# Altium footprint library Key & Switch's.PcbLib: 58 footprints (part 2 of 4)
Each footprint in its own frame and in the unit in brackets; x right, y up, seen from the top. Pads: shape width x height; smd on the part's side, far side on the other; paste and mask are expansions set on the pad; w line width, h text height; cw(c..) or ccw(c..) is an arc to the next point about the centre after c.
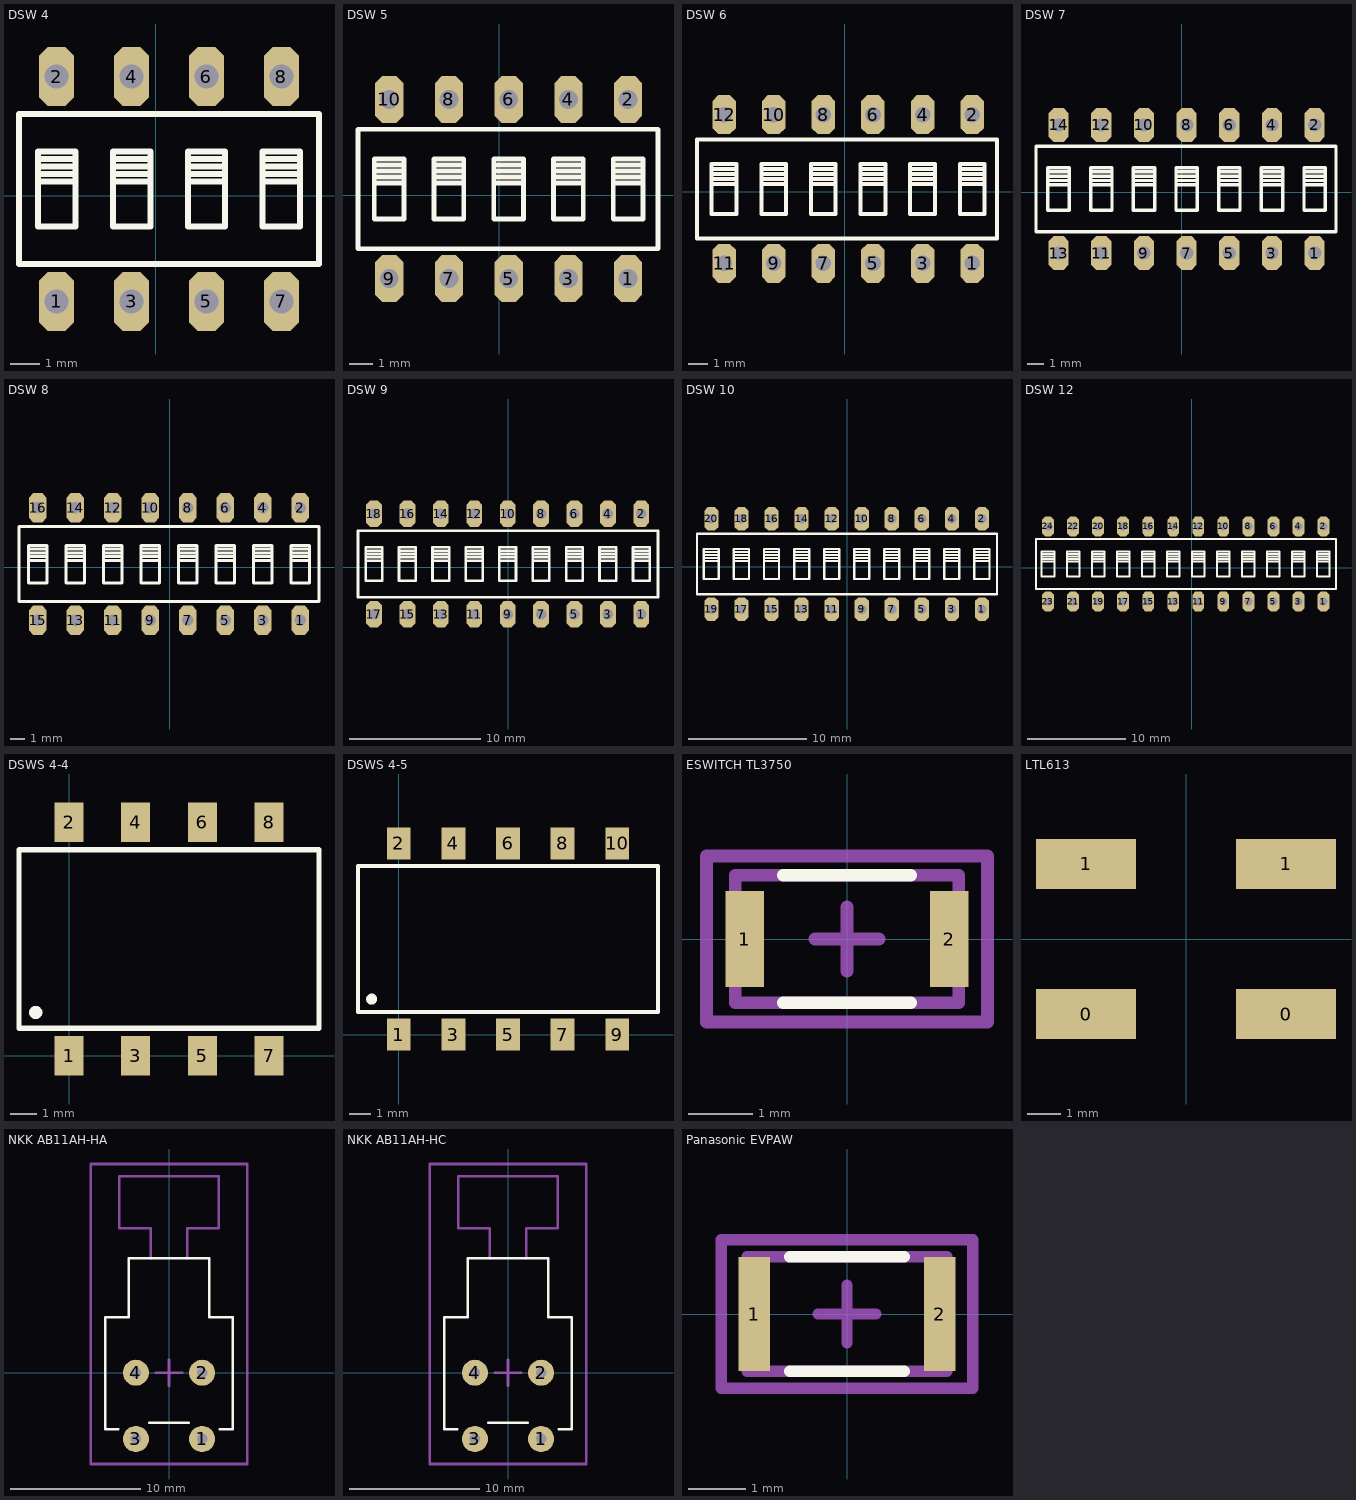
[diagram p1: the footprints below, top view; thin cyan lines are the x and y axes]

## DSW 4 [mm]
height 0.001
pads (8):
  oct 1.2x2 hole 0.8: 1(-3.364,-3.585) 2(-3.364,4.035) 3(-0.824,-3.585) 4(-0.824,4.035) 5(1.716,-3.585) 6(1.716,4.035) 7(4.256,-3.585) 8(4.256,4.035)
Top Overlay:
  lines w0.203: -3.999,0.479 -2.729,0.479 ; -3.999,0.733 -2.729,0.733 ; -3.999,0.987 -2.729,0.987 ; -3.999,1.241 -2.729,1.241 ; -1.459,0.479 -0.189,0.479 ; -1.459,0.733 -0.189,0.733 ; -1.459,0.987 -0.189,0.987 ; -1.459,1.241 -0.189,1.241 ; 1.081,0.479 2.351,0.479 ; 1.081,0.733 2.351,0.733 ; 1.081,0.987 2.351,0.987 ; 1.081,1.241 2.351,1.241 ; 3.621,0.479 4.891,0.479 ; 3.621,0.733 4.891,0.733 ; 3.621,0.987 4.891,0.987 ; 3.621,1.241 4.891,1.241 ; -4.634,-2.315 5.526,-2.315 5.526,2.765 -4.634,2.765 -4.634,-2.315 ; -3.999,-1.045 -2.729,-1.045 -2.729,1.495 -3.999,1.495 -3.999,-1.045 ; -1.459,-1.045 -0.189,-1.045 -0.189,1.495 -1.459,1.495 -1.459,-1.045 ; 1.081,-1.045 2.351,-1.045 2.351,1.495 1.081,1.495 1.081,-1.045 ; 3.621,-1.045 4.891,-1.045 4.891,1.495 3.621,1.495 3.621,-1.045
3D body "SWD1-4.step": height 8, standoff -2.7, extent -5.105,-4.7 6.055,5.2

## DSW 5 [mm]
height 0.001
pads (10):
  oct 1.2x2 hole 0.8: 1(5.471,-3.54) 2(5.471,4.08) 3(2.931,-3.54) 4(2.931,4.08) 5(0.391,-3.54) 6(0.391,4.08) 7(-2.149,-3.54) 8(-2.149,4.08) 9(-4.689,-3.54) 10(-4.689,4.08)
Top Overlay:
  lines w0.203: -5.324,0.524 -4.054,0.524 ; -5.324,0.778 -4.054,0.778 ; -5.324,1.032 -4.054,1.032 ; -5.324,1.286 -4.054,1.286 ; -2.784,0.524 -1.514,0.524 ; -2.784,0.778 -1.514,0.778 ; -2.784,1.032 -1.514,1.032 ; -2.784,1.286 -1.514,1.286 ; -0.244,0.524 1.026,0.524 ; -0.244,0.778 1.026,0.778 ; -0.244,1.032 1.026,1.032 ; -0.244,1.286 1.026,1.286 ; 2.296,0.524 3.566,0.524 ; 2.296,0.778 3.566,0.778 ; 2.296,1.032 3.566,1.032 ; 2.296,1.286 3.566,1.286 ; 4.836,0.524 6.106,0.524 ; 4.836,0.778 6.106,0.778 ; 4.836,1.032 6.106,1.032 ; 4.836,1.286 6.106,1.286 ; -6.015,-2.27 -6.015,2.81 6.741,2.81 6.741,-2.27 -6.015,-2.27 ; -5.324,-1 -5.324,1.54 -4.054,1.54 -4.054,-1 -5.324,-1 ; -2.784,-1 -2.784,1.54 -1.514,1.54 -1.514,-1 -2.784,-1 ; -0.244,-1 -0.244,1.54 1.026,1.54 1.026,-1 -0.244,-1 ; 2.296,-1 2.296,1.54 3.566,1.54 3.566,-1 2.296,-1 ; 4.836,-1 4.836,1.54 6.106,1.54 6.106,-1 4.836,-1
3D body "SWD1-5.step": height 8, standoff -2.7, extent -6.515,-4.665 7.185,5.235

## DSW 6 [mm]
pads (12):
  oct 1.2x2 hole 0.8: 1(6.511,-3.66) 2(6.511,3.96) 3(3.971,-3.66) 4(3.971,3.96) 5(1.431,-3.66) 6(1.431,3.96) 7(-1.109,-3.66) 8(-1.109,3.96) 9(-3.649,-3.66) 10(-3.649,3.96) 11(-6.189,-3.66) 12(-6.189,3.96)
Top Overlay:
  lines w0.203: -6.824,0.404 -5.554,0.404 ; -6.824,0.658 -5.554,0.658 ; -6.824,0.912 -5.554,0.912 ; -6.824,1.166 -5.554,1.166 ; -4.284,0.404 -3.014,0.404 ; -4.284,0.658 -3.014,0.658 ; -4.284,0.912 -3.014,0.912 ; -4.284,1.166 -3.014,1.166 ; -1.744,0.404 -0.474,0.404 ; -1.744,0.658 -0.474,0.658 ; -1.744,0.912 -0.474,0.912 ; -1.744,1.166 -0.474,1.166 ; 0.796,0.404 2.066,0.404 ; 0.796,0.658 2.066,0.658 ; 0.796,0.912 2.066,0.912 ; 0.796,1.166 2.066,1.166 ; 3.336,0.404 4.606,0.404 ; 3.336,0.658 4.606,0.658 ; 3.336,0.912 4.606,0.912 ; 3.336,1.166 4.606,1.166 ; 5.876,0.404 7.146,0.404 ; 5.876,0.658 7.146,0.658 ; 5.876,0.912 7.146,0.912 ; 5.876,1.166 7.146,1.166 ; -7.575,-2.39 -7.575,2.69 7.781,2.69 7.781,-2.39 -7.575,-2.39 ; -6.824,-1.12 -6.824,1.42 -5.554,1.42 -5.554,-1.12 -6.824,-1.12 ; -4.284,-1.12 -4.284,1.42 -3.014,1.42 -3.014,-1.12 -4.284,-1.12 ; -1.744,-1.12 -1.744,1.42 -0.474,1.42 -0.474,-1.12 -1.744,-1.12 ; 0.796,-1.12 0.796,1.42 2.066,1.42 2.066,-1.12 0.796,-1.12 ; 3.336,-1.12 3.336,1.42 4.606,1.42 4.606,-1.12 3.336,-1.12 ; 5.876,-1.12 5.876,1.42 7.146,1.42 7.146,-1.12 5.876,-1.12
3D body "SW3dPS-DIPSWITCH.STEP": height 7.9, standoff -2.2, extent -8.28,-4.945 8.48,5.215

## DSW 7 [mm]
pads (14):
  oct 1.2x2 hole 0.8: 1(7.921,-3.625) 2(7.921,3.995) 3(5.381,-3.625) 4(5.381,3.995) 5(2.841,-3.625) 6(2.841,3.995) 7(0.301,-3.625) 8(0.301,3.995) 9(-2.239,-3.625) 10(-2.239,3.995) 11(-4.779,-3.625) 12(-4.779,3.995) 13(-7.319,-3.625) 14(-7.319,3.995)
Top Overlay:
  lines w0.203: -7.954,0.439 -6.684,0.439 ; -7.954,0.693 -6.684,0.693 ; -7.954,0.947 -6.684,0.947 ; -7.954,1.201 -6.684,1.201 ; -5.414,0.439 -4.144,0.439 ; -5.414,0.693 -4.144,0.693 ; -5.414,0.947 -4.144,0.947 ; -5.414,1.201 -4.144,1.201 ; -2.874,0.439 -1.604,0.439 ; -2.874,0.693 -1.604,0.693 ; -2.874,0.947 -1.604,0.947 ; -2.874,1.201 -1.604,1.201 ; -0.334,0.439 0.936,0.439 ; -0.334,0.693 0.936,0.693 ; -0.334,0.947 0.936,0.947 ; -0.334,1.201 0.936,1.201 ; 2.206,0.439 3.476,0.439 ; 2.206,0.693 3.476,0.693 ; 2.206,0.947 3.476,0.947 ; 2.206,1.201 3.476,1.201 ; 4.746,0.439 6.016,0.439 ; 4.746,0.693 6.016,0.693 ; 4.746,0.947 6.016,0.947 ; 4.746,1.201 6.016,1.201 ; 7.286,0.439 8.556,0.439 ; 7.286,0.693 8.556,0.693 ; 7.286,0.947 8.556,0.947 ; 7.286,1.201 8.556,1.201 ; -8.665,-2.355 -8.665,2.725 9.191,2.725 9.191,-2.355 -8.665,-2.355 ; -7.954,-1.085 -7.954,1.455 -6.684,1.455 -6.684,-1.085 -7.954,-1.085 ; -5.414,-1.085 -5.414,1.455 -4.144,1.455 -4.144,-1.085 -5.414,-1.085 ; -2.874,-1.085 -2.874,1.455 -1.604,1.455 -1.604,-1.085 -2.874,-1.085 ; -0.334,-1.085 -0.334,1.455 0.936,1.455 0.936,-1.085 -0.334,-1.085 ; 2.206,-1.085 2.206,1.455 3.476,1.455 3.476,-1.085 2.206,-1.085 ; 4.746,-1.085 4.746,1.455 6.016,1.455 6.016,-1.085 4.746,-1.085 ; 7.286,-1.085 7.286,1.455 8.556,1.455 8.556,-1.085 7.286,-1.085
3D body "User Library-DIPSWITCH7.STEP": height 6.9, standoff -3.2, extent -9.316,-4.826 9.824,5.334

## DSW 8 [mm]
pads (16):
  oct 1.2x2 hole 0.8: 1(8.836,-3.575) 2(8.836,4.045) 3(6.296,-3.575) 4(6.296,4.045) 5(3.756,-3.575) 6(3.756,4.045) 7(1.216,-3.575) 8(1.216,4.045) 9(-1.324,-3.575) 10(-1.324,4.045) 11(-3.864,-3.575) 12(-3.864,4.045) 13(-6.404,-3.575) 14(-6.404,4.045) 15(-8.944,-3.575) 16(-8.944,4.045)
Top Overlay:
  lines w0.203: -9.579,0.489 -8.309,0.489 ; -9.579,0.743 -8.309,0.743 ; -9.579,0.997 -8.309,0.997 ; -9.579,1.251 -8.309,1.251 ; -7.039,0.489 -5.769,0.489 ; -7.039,0.743 -5.769,0.743 ; -7.039,0.997 -5.769,0.997 ; -7.039,1.251 -5.769,1.251 ; -4.499,0.489 -3.229,0.489 ; -4.499,0.743 -3.229,0.743 ; -4.499,0.997 -3.229,0.997 ; -4.499,1.251 -3.229,1.251 ; -1.959,0.489 -0.689,0.489 ; -1.959,0.743 -0.689,0.743 ; -1.959,0.997 -0.689,0.997 ; -1.959,1.251 -0.689,1.251 ; 0.581,0.489 1.851,0.489 ; 0.581,0.743 1.851,0.743 ; 0.581,0.997 1.851,0.997 ; 0.581,1.251 1.851,1.251 ; 3.121,0.489 4.391,0.489 ; 3.121,0.743 4.391,0.743 ; 3.121,0.997 4.391,0.997 ; 3.121,1.251 4.391,1.251 ; 5.661,0.489 6.931,0.489 ; 5.661,0.743 6.931,0.743 ; 5.661,0.997 6.931,0.997 ; 5.661,1.251 6.931,1.251 ; 8.201,0.489 9.471,0.489 ; 8.201,0.743 9.471,0.743 ; 8.201,0.997 9.471,0.997 ; 8.201,1.251 9.471,1.251 ; -10.214,-2.305 10.106,-2.305 10.106,2.775 -10.214,2.775 -10.214,-2.305 ; -9.579,-1.035 -8.309,-1.035 -8.309,1.505 -9.579,1.505 -9.579,-1.035 ; -7.039,-1.035 -5.769,-1.035 -5.769,1.505 -7.039,1.505 -7.039,-1.035 ; -4.499,-1.035 -3.229,-1.035 -3.229,1.505 -4.499,1.505 -4.499,-1.035 ; -1.959,-1.035 -0.689,-1.035 -0.689,1.505 -1.959,1.505 -1.959,-1.035 ; 0.581,-1.035 1.851,-1.035 1.851,1.505 0.581,1.505 0.581,-1.035 ; 3.121,-1.035 4.391,-1.035 4.391,1.505 3.121,1.505 3.121,-1.035 ; 5.661,-1.035 6.931,-1.035 6.931,1.505 5.661,1.505 5.661,-1.035 ; 8.201,-1.035 9.471,-1.035 9.471,1.505 8.201,1.505 8.201,-1.035
3D body "SW3dPS-DIP SWITCH 8 POS CTS 206.STEP": height 9.25, standoff -2.5, extent -11.275,-4.655 11.225,5.125

## DSW 9 [mm]
pads (18):
  oct 1.2x2 hole 0.8: 1(10.106,-3.575) 2(10.106,4.045) 3(7.566,-3.575) 4(7.566,4.045) 5(5.026,-3.575) 6(5.026,4.045) 7(2.486,-3.575) 8(2.486,4.045) 9(-0.054,-3.575) 10(-0.054,4.045) 11(-2.594,-3.575) 12(-2.594,4.045) 13(-5.134,-3.575) 14(-5.134,4.045) 15(-7.674,-3.575) 16(-7.674,4.045) 17(-10.214,-3.575) 18(-10.214,4.045)
Top Overlay:
  lines w0.203: -10.849,0.489 -9.579,0.489 ; -10.849,0.743 -9.579,0.743 ; -10.849,0.997 -9.579,0.997 ; -10.849,1.251 -9.579,1.251 ; -8.309,0.489 -7.039,0.489 ; -8.309,0.743 -7.039,0.743 ; -8.309,0.997 -7.039,0.997 ; -8.309,1.251 -7.039,1.251 ; -5.769,0.489 -4.499,0.489 ; -5.769,0.743 -4.499,0.743 ; -5.769,0.997 -4.499,0.997 ; -5.769,1.251 -4.499,1.251 ; -3.229,0.489 -1.959,0.489 ; -3.229,0.743 -1.959,0.743 ; -3.229,0.997 -1.959,0.997 ; -3.229,1.251 -1.959,1.251 ; -0.689,0.489 0.581,0.489 ; -0.689,0.743 0.581,0.743 ; -0.689,0.997 0.581,0.997 ; -0.689,1.251 0.581,1.251 ; 1.851,0.489 3.121,0.489 ; 1.851,0.743 3.121,0.743 ; 1.851,0.997 3.121,0.997 ; 1.851,1.251 3.121,1.251 ; 4.391,0.489 5.661,0.489 ; 4.391,0.743 5.661,0.743 ; 4.391,0.997 5.661,0.997 ; 4.391,1.251 5.661,1.251 ; 6.931,0.489 8.201,0.489 ; 6.931,0.743 8.201,0.743 ; 6.931,0.997 8.201,0.997 ; 6.931,1.251 8.201,1.251 ; 9.471,0.489 10.741,0.489 ; 9.471,0.743 10.741,0.743 ; 9.471,0.997 10.741,0.997 ; 9.471,1.251 10.741,1.251 ; -11.43,-2.305 11.376,-2.305 11.376,2.775 -11.43,2.775 -11.43,-2.305 ; -10.849,-1.035 -10.849,1.505 -9.579,1.505 -9.579,-1.035 -10.849,-1.035 ; -8.309,-1.035 -7.039,-1.035 -7.039,1.505 -8.309,1.505 -8.309,-1.035 ; -5.769,-1.035 -4.499,-1.035 -4.499,1.505 -5.769,1.505 -5.769,-1.035 ; -3.229,-1.035 -1.959,-1.035 -1.959,1.505 -3.229,1.505 -3.229,-1.035 ; -0.689,-1.035 0.581,-1.035 0.581,1.505 -0.689,1.505 -0.689,-1.035 ; 1.851,-1.035 3.121,-1.035 3.121,1.505 1.851,1.505 1.851,-1.035 ; 4.391,-1.035 5.661,-1.035 5.661,1.505 4.391,1.505 4.391,-1.035 ; 6.931,-1.035 8.201,-1.035 8.201,1.505 6.931,1.505 6.931,-1.035 ; 9.471,-1.035 10.741,-1.035 10.741,1.505 9.471,1.505 9.471,-1.035
3D body "User Library-DIPSWITCH9.STEP": height 7.4, standoff -2.7, extent -12.237,-4.826 11.983,5.334

## DSW 10 [mm]
pads (20):
  oct 1.2x2 hole 0.8: 1(11.376,-3.575) 2(11.376,4.045) 3(8.836,-3.575) 4(8.836,4.045) 5(6.296,-3.575) 6(6.296,4.045) 7(3.756,-3.575) 8(3.756,4.045) 9(1.216,-3.575) 10(1.216,4.045) 11(-1.324,-3.575) 12(-1.324,4.045) 13(-3.864,-3.575) 14(-3.864,4.045) 15(-6.404,-3.575) 16(-6.404,4.045) 17(-8.944,-3.575) 18(-8.944,4.045) 19(-11.484,-3.575) 20(-11.484,4.045)
Top Overlay:
  lines w0.203: -12.119,0.489 -10.849,0.489 ; -12.119,0.743 -10.849,0.743 ; -12.119,0.997 -10.849,0.997 ; -12.119,1.251 -10.849,1.251 ; -9.579,0.489 -8.309,0.489 ; -9.579,0.743 -8.309,0.743 ; -9.579,0.997 -8.309,0.997 ; -9.579,1.251 -8.309,1.251 ; -7.039,0.489 -5.769,0.489 ; -7.039,0.743 -5.769,0.743 ; -7.039,0.997 -5.769,0.997 ; -7.039,1.251 -5.769,1.251 ; -4.499,0.489 -3.229,0.489 ; -4.499,0.743 -3.229,0.743 ; -4.499,0.997 -3.229,0.997 ; -4.499,1.251 -3.229,1.251 ; -1.959,0.489 -0.689,0.489 ; -1.959,0.743 -0.689,0.743 ; -1.959,0.997 -0.689,0.997 ; -1.959,1.251 -0.689,1.251 ; 0.581,0.489 1.851,0.489 ; 0.581,0.743 1.851,0.743 ; 0.581,0.997 1.851,0.997 ; 0.581,1.251 1.851,1.251 ; 3.121,0.489 4.391,0.489 ; 3.121,0.743 4.391,0.743 ; 3.121,0.997 4.391,0.997 ; 3.121,1.251 4.391,1.251 ; 5.661,0.489 6.931,0.489 ; 5.661,0.743 6.931,0.743 ; 5.661,0.997 6.931,0.997 ; 5.661,1.251 6.931,1.251 ; 8.201,0.489 9.471,0.489 ; 8.201,0.743 9.471,0.743 ; 8.201,0.997 9.471,0.997 ; 8.201,1.251 9.471,1.251 ; 10.741,0.489 12.011,0.489 ; 10.741,0.743 12.011,0.743 ; 10.741,0.997 12.011,0.997 ; 10.741,1.251 12.011,1.251 ; -12.7,-2.305 -12.7,2.775 12.646,2.775 12.646,-2.305 -12.7,-2.305 ; -12.119,-1.035 -12.119,1.505 -10.849,1.505 -10.849,-1.035 -12.119,-1.035 ; -9.579,-1.035 -8.309,-1.035 -8.309,1.505 -9.579,1.505 -9.579,-1.035 ; -7.039,-1.035 -7.039,1.505 -5.769,1.505 -5.769,-1.035 -7.039,-1.035 ; -4.499,-1.035 -4.499,1.505 -3.229,1.505 -3.229,-1.035 -4.499,-1.035 ; -1.959,-1.035 -1.959,1.505 -0.689,1.505 -0.689,-1.035 -1.959,-1.035 ; 0.581,-1.035 0.581,1.505 1.851,1.505 1.851,-1.035 0.581,-1.035 ; 3.121,-1.035 3.121,1.505 4.391,1.505 4.391,-1.035 3.121,-1.035 ; 5.661,-1.035 5.661,1.505 6.931,1.505 6.931,-1.035 5.661,-1.035 ; 8.201,-1.035 8.201,1.505 9.471,1.505 9.471,-1.035 8.201,-1.035 ; 10.741,-1.035 10.741,1.505 12.011,1.505 12.011,-1.035 10.741,-1.035
3D body "User Library-DIPSWITCH10.STEP": height 7.4, standoff -2.7, extent -13.507,-4.826 13.253,5.334

## DSW 12 [mm]
pads (24):
  oct 1.2x2 hole 0.8: 1(13.335,-3.429) 2(13.335,4.191) 3(10.795,-3.429) 4(10.795,4.191) 5(8.255,-3.429) 6(8.255,4.191) 7(5.715,-3.429) 8(5.715,4.191) 9(3.175,-3.429) 10(3.175,4.191) 11(0.635,-3.429) 12(0.635,4.191) 13(-1.905,-3.429) 14(-1.905,4.191) 15(-4.445,-3.429) 16(-4.445,4.191) 17(-6.985,-3.429) 18(-6.985,4.191) 19(-9.525,-3.429) 20(-9.525,4.191) 21(-12.065,-3.429) 22(-12.065,4.191) 23(-14.605,-3.429) 24(-14.605,4.191)
Top Overlay:
  lines w0.203: -15.24,0.635 -13.97,0.635 ; -15.24,0.889 -13.97,0.889 ; -15.24,1.143 -13.97,1.143 ; -15.24,1.397 -13.97,1.397 ; -12.7,0.635 -11.43,0.635 ; -12.7,0.889 -11.43,0.889 ; -12.7,1.143 -11.43,1.143 ; -12.7,1.397 -11.43,1.397 ; -10.16,0.635 -8.89,0.635 ; -10.16,0.889 -8.89,0.889 ; -10.16,1.143 -8.89,1.143 ; -10.16,1.397 -8.89,1.397 ; -7.62,0.635 -6.35,0.635 ; -7.62,0.889 -6.35,0.889 ; -7.62,1.143 -6.35,1.143 ; -7.62,1.397 -6.35,1.397 ; -5.08,0.635 -3.81,0.635 ; -5.08,0.889 -3.81,0.889 ; -5.08,1.143 -3.81,1.143 ; -5.08,1.397 -3.81,1.397 ; -2.54,0.635 -1.27,0.635 ; -2.54,0.889 -1.27,0.889 ; -2.54,1.143 -1.27,1.143 ; -2.54,1.397 -1.27,1.397 ; 0,0.635 1.27,0.635 ; 0,0.889 1.27,0.889 ; 0,1.143 1.27,1.143 ; 0,1.397 1.27,1.397 ; 2.54,0.635 3.81,0.635 ; 2.54,0.889 3.81,0.889 ; 2.54,1.143 3.81,1.143 ; 2.54,1.397 3.81,1.397 ; 5.08,0.635 6.35,0.635 ; 5.08,0.889 6.35,0.889 ; 5.08,1.143 6.35,1.143 ; 5.08,1.397 6.35,1.397 ; 7.62,0.635 8.89,0.635 ; 7.62,0.889 8.89,0.889 ; 7.62,1.143 8.89,1.143 ; 7.62,1.397 8.89,1.397 ; 10.16,0.635 11.43,0.635 ; 10.16,0.889 11.43,0.889 ; 10.16,1.143 11.43,1.143 ; 10.16,1.397 11.43,1.397 ; 12.7,0.635 13.97,0.635 ; 12.7,0.889 13.97,0.889 ; 12.7,1.143 13.97,1.143 ; 12.7,1.397 13.97,1.397 ; -15.821,-2.159 -15.821,2.921 14.605,2.921 14.605,-2.159 -15.821,-2.159 ; -15.24,-0.889 -13.97,-0.889 -13.97,1.651 -15.24,1.651 -15.24,-0.889 ; -12.7,-0.889 -11.43,-0.889 -11.43,1.651 -12.7,1.651 -12.7,-0.889 ; -10.16,-0.889 -10.16,1.651 -8.89,1.651 -8.89,-0.889 -10.16,-0.889 ; -7.62,-0.889 -6.35,-0.889 -6.35,1.651 -7.62,1.651 -7.62,-0.889 ; -5.08,-0.889 -5.08,1.651 -3.81,1.651 -3.81,-0.889 -5.08,-0.889 ; -2.54,-0.889 -2.54,1.651 -1.27,1.651 -1.27,-0.889 -2.54,-0.889 ; 0,-0.889 0,1.651 1.27,1.651 1.27,-0.889 0,-0.889 ; 2.54,-0.889 2.54,1.651 3.81,1.651 3.81,-0.889 2.54,-0.889 ; 5.08,-0.889 5.08,1.651 6.35,1.651 6.35,-0.889 5.08,-0.889 ; 7.62,-0.889 7.62,1.651 8.89,1.651 8.89,-0.889 7.62,-0.889 ; 10.16,-0.889 10.16,1.651 11.43,1.651 11.43,-0.889 10.16,-0.889 ; 12.7,-0.889 12.7,1.651 13.97,1.651 13.97,-0.889 12.7,-0.889
3D body "User Library-DIPSWITCH12.STEP": height 7.4, standoff -2.7, extent -16.603,-4.68 15.237,5.48

## DSWS 4-4 [mm]
height 0.001
pads (8):
  rect 1.1x1.5 smd: 1(0,0) 2(0,8.9) 3(2.54,0) 4(2.54,8.9) 5(5.08,0) 6(5.08,8.9) 7(7.62,0) 8(7.62,8.9)
Top Overlay:
  circle w0.254: c-1.27,1.651 r0.127
  lines w0.2: -1.905,1.05 -1.905,7.85 9.525,7.85 9.525,1.05 -1.905,1.05
3D body "SWD4-4e.stp": height 4.4, standoff 0, extent -1.74,-0.455 9.36,9.345

## DSWS 4-5 [mm]
height 0.001
pads (10):
  rect 1.1x1.5 smd: 1(0,0) 2(0,8.9) 3(2.54,0) 4(2.54,8.9) 5(5.08,0) 6(5.08,8.9) 7(7.62,0) 8(7.62,8.9) 9(10.16,0) 10(10.16,8.9)
Top Overlay:
  circle w0.254: c-1.27,1.651 r0.127
  lines w0.2: -1.905,1.05 -1.905,7.85 12.065,7.85 12.065,1.05 -1.905,1.05
3D body "SWD4-5e.stp": height 4.4, standoff 0, extent -1.74,-0.455 11.9,9.345

## ESWITCH TL3750 [mm]
height 0.6
pads (2):
  rect 0.6x1.5 smd: 1(-1.6,0) 2(1.6,0)
Top Overlay:
  lines w0.2: -1,-1 1,-1 ; -1,1 1,1
Mechanical 1:
  lines w0.2: -1.75,-1 -1.75,1 1.75,1 1.75,-1 -1.75,-1
Mechanical 15:
  lines w0.2: -0.5,0 0.5,0 ; 0,-0.5 0,0.5 ; -2.2,-1.3 -2.2,1.3 2.2,1.3 2.2,-1.3 -2.2,-1.3
3D body "TL3750AFxxxQG.STEP": height 0.58, standoff 0, extent -1.75,-1 1.75,1

## LTL613 [mm]
pads (4):
  rect 3x1.5 smd: 0(-3,-2.25) 0(3,-2.25) 1(-3,2.25) 1(3,2.25)
3D body "LTL613.stp": height 5, standoff 0, extent -4.039,-3 4.039,3

## NKK AB11AH-HA [mm]
height 6.18
pads (4):
  round 2 hole 0.8: 1(2.54,-5.08) 2(2.54,0) 3(-2.54,-5.08) 4(-2.54,0)
Top Overlay:
  lines w0.2: -3.9,-4.34 -4.9,-4.34 -4.9,4.26 -3.1,4.26 -3.1,8.76 3.1,8.76 3.1,4.26 4.9,4.26 4.9,-4.34 3.9,-4.34 ; -1.5,-3.84 1.5,-3.84
Mechanical 1:
  lines w0.2: -1.4,8.76 -1.4,11.06 -3.8,11.06 -3.8,15.06 3.8,15.06 3.8,11.06 1.4,11.06 1.4,8.76
Mechanical 15:
  lines w0.2: -1,0 1,0 ; 0,-1 0,1 ; -6,-7 -6,16 6,16 6,-7 -6,-7
3D body "NKK AB11AH-HA.STEP": height 7.06, standoff -3.1, extent -4.902,-5.39 4.902,15.082

## NKK AB11AH-HC [mm]
height 6.18
pads (4):
  round 2 hole 0.8: 1(2.54,-5.08) 2(2.54,0) 3(-2.54,-5.08) 4(-2.54,0)
Top Overlay:
  lines w0.2: -3.9,-4.34 -4.9,-4.34 -4.9,4.26 -3.1,4.26 -3.1,8.76 3.1,8.76 3.1,4.26 4.9,4.26 4.9,-4.34 3.9,-4.34 ; -1.5,-3.84 1.5,-3.84
Mechanical 1:
  lines w0.2: -1.4,8.76 -1.4,11.06 -3.8,11.06 -3.8,15.06 3.8,15.06 3.8,11.06 1.4,11.06 1.4,8.76
Mechanical 15:
  lines w0.2: -1,0 1,0 ; 0,-1 0,1 ; -6,-7 6,-7 6,16 -6,16 -6,-7
3D body "NKK AB11AH-HC.STEP": height 7.06, standoff -3.1, extent -4.902,-5.39 4.902,15.082

## Panasonic EVPAW [mm]
height 0.6
pads (2):
  rect 0.55x2 smd: 1(-1.625,0) 2(1.625,0)
Top Overlay:
  lines w0.2: -1,-1 1,-1 ; -1,1 1,1
Mechanical 1:
  lines w0.2: -1.75,-1 1.75,-1 1.75,1 -1.75,1 -1.75,-1
Mechanical 15:
  lines w0.2: -0.5,0 0.5,0 ; 0,-0.5 0,0.5 ; -2.2,-1.3 2.2,-1.3 2.2,1.3 -2.2,1.3 -2.2,-1.3
3D body "PANASONIC EVPAW.STEP": height 0.58, standoff 0, extent -1.75,-1 1.75,1

## PCBComponent_1 [mm]